# Altium footprint library custom.PcbLib: 317 footprints (part 10 of 20)
Each footprint in its own frame and in the unit in brackets; x right, y up, seen from the top. Pads: shape width x height; smd on the part's side, far side on the other; paste and mask are expansions set on the pad; w line width, h text height; cw(c..) or ccw(c..) is an arc to the next point about the centre after c.
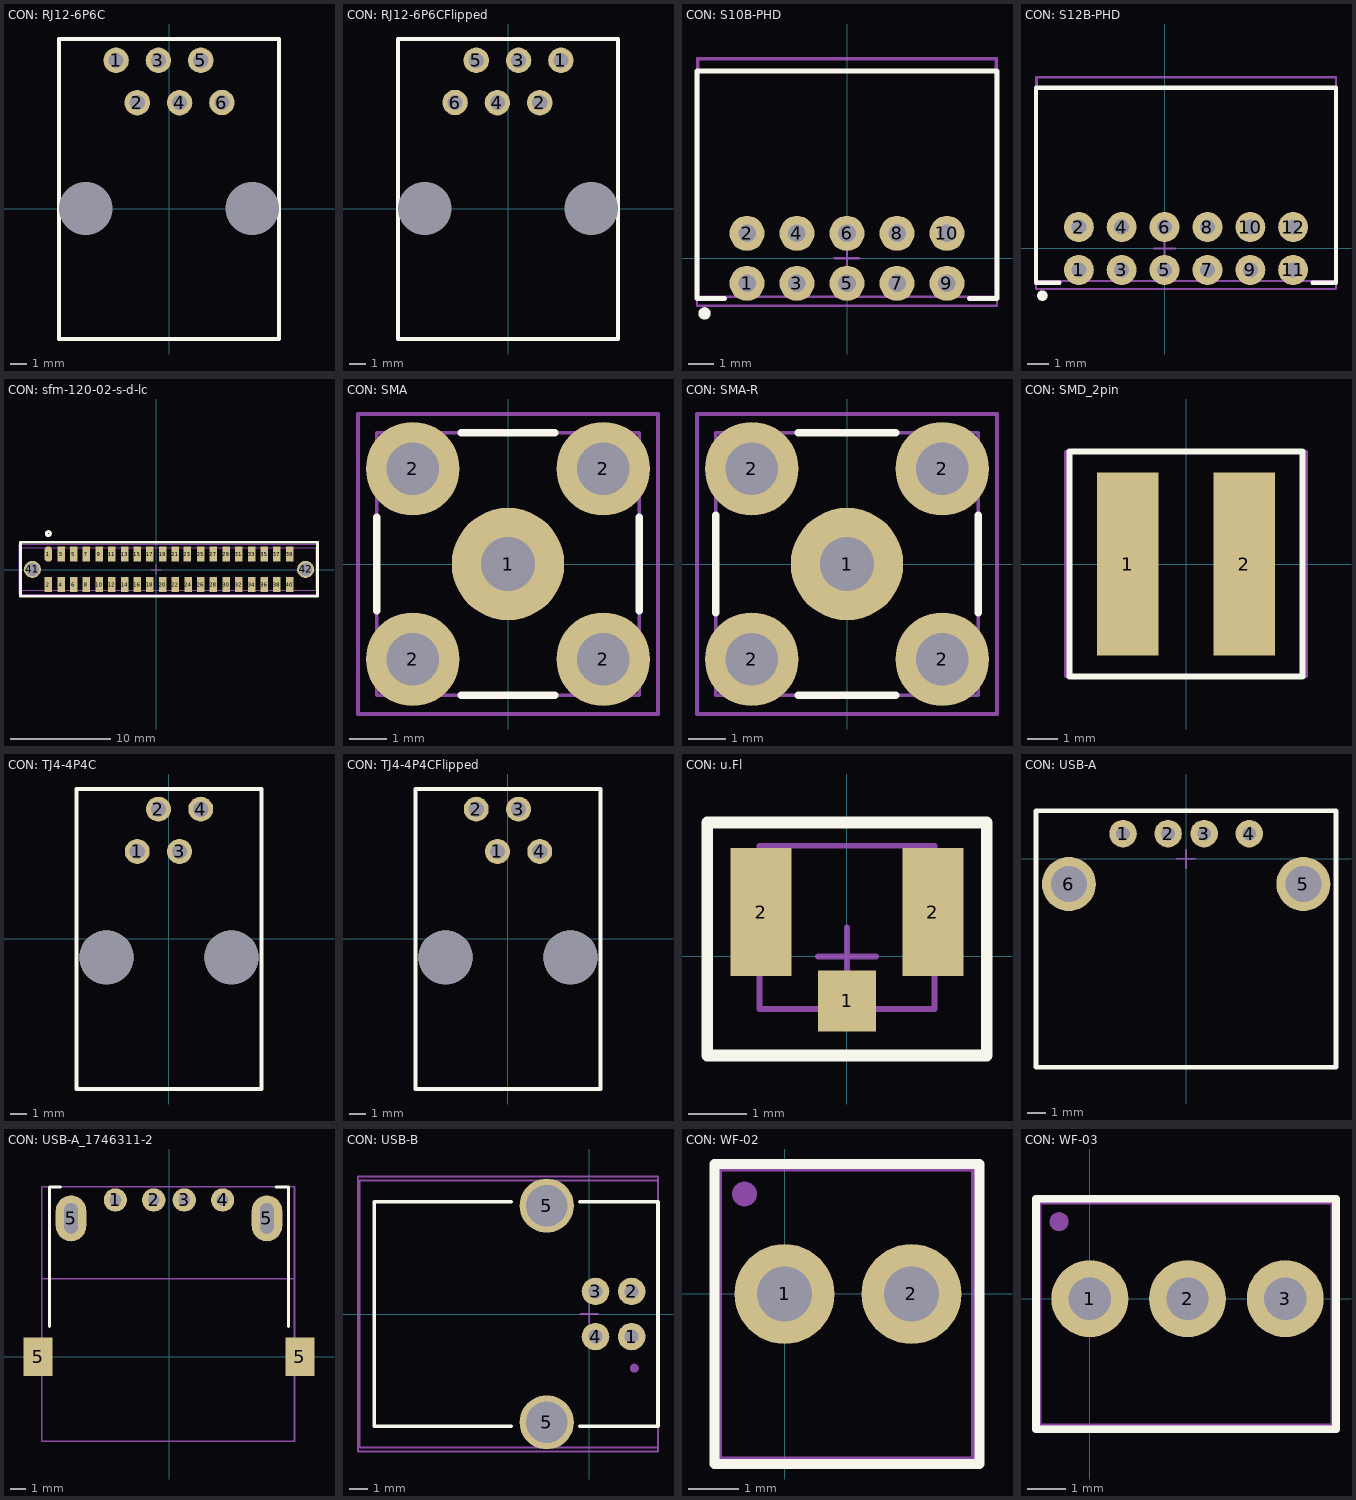
[diagram p9: the footprints below, top view; thin cyan lines are the x and y axes]

## CON: RJ12-6P6C [mil]
pads (8):
  round 60 hole 35.43: 1(-125,350) 2(-75,250) 3(-25,350) 4(25,250) 5(75,350) 6(125,250.39)
  round 60 hole 125.98 unplated: ""(-196.85,0) ""(196.85,0)
Top Overlay:
  lines w10: -259.84,-308.27 259.84,-308.27 259.84,400.39 -259.84,400.39 -259.84,-308.27
3D body "RJ12-6P6C.SLDPRT": height 460.63, standoff -129.92, extent -259.84,-308.27 259.84,400.39

## CON: RJ12-6P6CFlipped [mil]
pads (8):
  round 60 / inner round 60 / far side round 0 hole 35.43 unplated paste-99999: 1(125,350) 2(75,250) 3(25,350) 4(-25,250) 5(-75,350) 6(-125,250.39)
  round 60 hole 125.98 unplated: ""(-196.85,0) ""(196.85,0)
Top Overlay:
  lines w10: -259.84,-308.27 -259.84,400.39 259.84,400.39 259.84,-308.27 -259.84,-308.27
3D body "RJ12-6P6C.SLDPRT": height 70.87, standoff -519.68, extent -259.84,-308.27 259.84,400.39

## CON: S10B-PHD [mm]
pads (11):
  round 1.4 hole 0.7: 1(-4,-1) 2(-4,1) 3(-2,-1) 4(-2,1) 5(0,-1) 6(0,1) 7(2,-1) 8(2,1) 9(4,-1) 10(4,1)
  round 0.5 on Top Overlay: ""(-5.7,-2.2)
Top Overlay:
  lines w0.2: -4.9,-1.6 -5.9,-1.6 -6,-1.6 -6,7.5 6,7.5 6,-1.6 5.9,-1.6 4.9,-1.6
Top Assy:
  lines w0.1: -5.95,-1.525 5.95,-1.525 5.95,7.975 -5.95,7.975 -5.95,-1.525
Size Area:
  lines w0.1: -0.5,0 0.5,0 ; 0,-0.5 0,0.5 ; -6,-1.9 6,-1.9 6,8 -6,8 -6,-1.9
3D body "S10B-PHD.STEP": height 5, standoff -3, extent -5.95,-1.525 5.95,7.975

## CON: S12B-PHD [mm]
pads (13):
  round 1.4 hole 0.7: 1(-4,-1) 2(-4,1) 3(-2,-1) 4(-2,1) 5(0,-1) 6(0,1) 7(2,-1) 8(2,1) 9(4,-1) 10(4,1) 11(6,-1) 12(6,1)
  round 0.5 on Top Overlay: ""(-5.7,-2.2)
Top Overlay:
  lines w0.2: -4.9,-1.6 -5.9,-1.6 -6,-1.6 -6,7.5 8,7.5 8,-1.6 ; 6.9,-1.6 7.9,-1.6
Top Assy:
  lines w0.1: -5.95,-1.525 -5.95,7.975 8,7.975 8,-1.525 -5.95,-1.525
Size Area:
  lines w0.1: -0.5,0 0.5,0 ; 0,-0.5 0,0.5 ; -6,-1.9 8,-1.9 8,8 -6,8 -6,-1.9
3D body "S12B-PHDSS.STEP": height 5, standoff 0, extent -5.95,-1.525 7.95,7.975

## CON: sfm-120-02-s-d-lc [mm]
height 10
pads (42):
  oct 0.75x1.5 smd: 1(-10.8,1.55)
  rect 0.75x1.5 smd: 2(-10.8,-1.5) 3(-9.53,1.55) 4(-9.53,-1.5) 5(-8.26,1.55) 6(-8.26,-1.5) 7(-6.99,1.55) 8(-6.99,-1.5) 9(-5.72,1.55) 10(-5.72,-1.5) 11(-4.45,1.55) 12(-4.45,-1.5) 13(-3.18,1.55) 14(-3.18,-1.5) 15(-1.91,1.55) 16(-1.91,-1.5) 17(-0.64,1.55) 18(-0.64,-1.5) 19(0.63,1.55) 20(0.63,-1.5) 21(1.9,1.55) 22(1.9,-1.5) 23(3.11,1.55) 24(3.17,-1.5) 25(4.44,1.55) 26(4.44,-1.5) 27(5.71,1.55) 28(5.71,-1.5) 29(6.98,1.55) 30(6.98,-1.5) 31(8.25,1.55) 32(8.25,-1.5) 33(9.52,1.55) 34(9.52,-1.5) 35(10.79,1.55) 36(10.79,-1.5) 37(12.06,1.55) 38(12.06,-1.5) 39(13.33,1.55) 40(13.33,-1.5)
  round 1.7 hole 1.3: 41(-12.39,0.025) 42(14.92,0.025)
Top Overlay:
  circle w0.3: c-10.8,3.6 r0.2
  lines w0.254: -13.585,-2.675 16.115,-2.675 16.115,2.725 -13.585,2.725 -13.585,-2.675
Top Assy:
  lines w0.1: -13.435,-2.075 -13.435,2.2 15.965,2.2 15.965,-2.075 -13.435,-2.075
Size Area:
  lines w0.05: -13.735,-2.475 16.265,-2.475 16.265,2.525 -13.735,2.525 -13.735,-2.475
  lines w0.1: -0.5,-0.03 0.5,-0.03 ; 0,-0.53 0,0.47
3D body "SFM-120-02-L-D-LC-TR.stp": height 4.72, standoff -1.5, extent -13.403,-2.07 15.934,2.184

## CON: SMA [mm]
pads (5):
  round 3 hole 1.45: 1(0,0)
  round 2.5 hole 1.4: 2(-2.54,-2.54) 2(-2.54,2.54) 2(2.54,-2.54) 2(2.54,2.54)
Top Overlay:
  lines w0.2: -3.5,-1.25 -3.5,1.25 ; -1.25,-3.5 1.25,-3.5 ; -1.25,3.5 1.25,3.5 ; 3.5,-1.25 3.5,1.25
Top Assy:
  lines w0.1: -3.5,-3.5 -3.5,3.5 3.5,3.5 3.5,-3.5 -3.5,-3.5
Size Area:
  lines w0.1: -0.5,0 0.5,0 ; 0,-0.5 0,0.5 ; -4,-4 4,-4 4,4 -4,4 -4,-4
3D body "SMA_connector.STEP": height 9.53, standoff -3.94, extent -3.5,-3.5 3.5,3.5

## CON: SMA-R [mm]
pads (5):
  round 3 hole 1.45: 1(0,0)
  round 2.5 hole 1.4: 2(-2.54,-2.54) 2(-2.54,2.54) 2(2.54,-2.54) 2(2.54,2.54)
Top Overlay:
  lines w0.2: -3.5,-1.3 -3.5,1.3 ; -1.3,-3.5 1.3,-3.5 ; -1.3,3.5 1.3,3.5 ; 3.5,-1.3 3.5,1.3
Top Assy:
  lines w0.1: -3.5,-3.5 -3.5,3.5 3.5,3.5 3.5,-3.5 -3.5,-3.5
Size Area:
  lines w0.1: -0.5,0 0.5,0 ; 0,-0.5 0,0.5 ; -4,-4 4,-4 4,4 -4,4 -4,-4
3D body "Samtec-SMA-J-P-H-RA-TH1.STEP": height 10.26, standoff -3.84, extent -3.5,-3.5 3.5,11.6

## CON: SMD_2pin [mm] "3.81 2pin screw connector"
height 9
pads (2):
  rect 2x6 smd: 1(-1.905,0) 2(1.905,0)
Top Overlay:
  lines w0.2: -3.81,-3.683 3.81,-3.683 3.81,3.683 -3.81,3.683 -3.81,-3.683
Top Assy:
  lines w0.1: -3.815,-3.5 -3.815,3.5 ; 3.805,-3.5 3.805,3.5
Size Area:
  lines w0.1: -3.937,-3.683 3.937,-3.683 3.937,3.683 -3.937,3.683 -3.937,-3.683

## CON: TJ4-4P4C [mil] "TJ4-4P4C"
pads (6):
  round 59 hole 36 paste-99999 mask+2: 1(-75,206.69) 2(-25,306.69) 3(25,206.69) 4(75,306.69)
  round 127.95 hole 127.95 unplated paste-99999: ""(-147.64,-43.31) ""(147.64,-43.31)
Top Overlay:
  lines w10: -218.5,-354.33 218.5,-354.33 218.5,354.33 -218.5,354.33 -218.5,-354.33
Size Area:
  circle w59.05: c-147.64,-43.31 r29.53
  circle w59.05: c147.64,-43.31 r29.53
3D body "TJ4-4P4C.SLDPRT": height 452.76, standoff -137.8, extent -220.47,-351.38 220.47,357.28

## CON: TJ4-4P4CFlipped [mil]
pads (6):
  round 59 / inner round 59 / far side round 0 hole 36 unplated paste-99999: 1(-25,206.69) 2(-75,306.69) 3(25,306.69) 4(75,206.69)
  round 127.95 hole 127.95 unplated paste-99999: ""(-147.64,-43.31) ""(147.64,-43.31)
Top Overlay:
  lines w10: -218.5,-354.33 218.5,-354.33 218.5,354.33 -218.5,354.33 -218.5,-354.33
Size Area:
  circle w59.05: c-147.64,-43.31 r29.53
  circle w59.05: c147.64,-43.31 r29.53
3D body "TJ4-4P4C.STEP": height 78.74, standoff -511.81, extent -220.47,-351.38 220.47,357.28

## CON: u.Fl [mm]
height 1.5
pads (3):
  rect 1x1.05 smd: 1(0,-0.763)
  rect 1.05x2.2 smd: 2(-1.475,0.763) 2(1.475,0.763)
Top Overlay:
  lines w0.2: -2.4,-1.7 2.4,-1.7 2.4,2.3 -2.4,2.3 -2.4,-1.7
Top Assy:
  lines w0.1: -1.5,-0.9 1.5,-0.9 1.5,1.9 -1.5,1.9 -1.5,-0.9
Size Area:
  lines w0.1: -0.5,0 0.5,0 ; 0,-0.5 0,0.5 ; -2.4,-1.7 -2.4,2.3 2.4,2.3 2.4,-1.7 -2.4,-1.7
3D body "IPX.step": height 1.27, standoff -0.01, extent -1.5,-0.95 1.5,1.9

## CON: USB-A [mil]
height 196.85
pads (6):
  round 60 hole 30: 1(-137.8,55) 2(-39.37,55) 3(39.37,55) 4(137.8,55)
  round 118.11 hole 78.74: 5(255.91,-55) 6(-255.91,-55)
Top Overlay:
  lines w10: -327.8,-455 327.2,-455 327.2,105 -327.8,105 -327.8,-455
Top Assy:
  lines w3.94: -327.8,-455 327.2,-455 327.2,105 -327.8,105 -327.8,-455
Size Area:
  lines w1.97: -327.8,-455 -327.8,105 327.2,105 327.2,-455 -327.8,-455
  lines w3.94: -19.69,0 19.68,0 ; 0,-19.68 0,19.69
3D body "USB_A_PCB.STEP": height 301.38, standoff -142.52, extent -319.08,-456.41 320.05,94.77

## CON: USB-A_1746311-2 [mm]
pads (8):
  round 1.524 hole 0.762: 1(-3.5,10.25) 2(-1,10.25) 3(1,10.25) 4(3.5,10.25)
  rect 1.9x2.5 smd: 5(-8.55,0) 5(8.55,0)
  oval 2x3 hole 0.9 slot 2 at 90 deg: 5(-6.4,9.05) 5(6.4,9.05)
Top Overlay:
  lines w0.2: -7.8,2 -7.8,11.1 -7.1,11.1 ; 7,11.1 7.8,11.1 7.8,2
Top Assy:
  lines w0.1: -8.3,5.1 8.2,5.1 ; -8.3,-5.5 -8.3,-1 -8.3,1 -8.3,11.1 8.2,11.1 8.2,1 8.2,-1 8.2,-5.5 -8.3,-5.5
3D body "c-1746311-2-g1-3d.stp": height 4.1, standoff -4.52, extent -8.25,-5.45 8.25,11.05

## CON: USB-B [mm] "USB-B connector on PCB"
height 12
pads (7):
  round 1.524 hole 0.762: 1(2.35,-1.25) 2(2.35,1.25) 3(0.35,1.25) 4(0.35,-1.25)
  round 3 hole 2.3: 5(-2.35,-6) 5(-2.35,6)
  round 0.5 on Mech1: ""(2.5,-3)
Top Overlay:
  lines w0.2: -4.318,-6.223 -11.9,-6.223 -11.9,6.223 -4.318,6.223 ; -0.508,-6.223 3.81,-6.223 3.81,6.223 -0.508,6.223
Top Assy:
  lines w0.1: -12.708,-7.399 3.792,-7.399 3.792,7.4 -12.708,7.4 -12.708,-7.399
Size Area:
  lines w0.1: -0.5,0 0.5,0 ; 0,-0.5 0,0.5 ; -12.8,-7.62 -12.8,7.62 3.81,7.62 3.81,-7.62 -12.8,-7.62
3D body "USB-B-S-X-W-TH.STEP": height 11, standoff -3.64, extent -12.708,-7.398 3.792,7.4

## CON: WF-02 [mm]
pads (3):
  round 2 hole 1.1: 1(0,0) 2(2.54,0)
  round 0.5 on Mech1: ""(-0.8,2)
Top Overlay:
  lines w0.2: -1.4,-3.4 -1.4,2.6 3.9,2.6 3.9,-3.4 -1.4,-3.4
Top Assy:
  lines w0.1: -1.3,-3.3 3.78,-3.3 3.78,2.5 -1.3,2.5 -1.3,-3.3
3D body "User Library-WF-02.STEP": height 11.5, standoff -3.3, extent -1.3,-3.3 3.78,2.5

## CON: WF-03 [mm]
pads (4):
  round 2 hole 1.1: 1(0,0) 2(2.54,0) 3(5.08,0)
  round 0.5 on Mech1: ""(-0.8,2)
Top Overlay:
  lines w0.2: -1.4,-3.4 6.4,-3.4 6.4,2.6 -1.4,2.6 -1.4,-3.4
Top Assy:
  lines w0.1: -1.31,-3.3 6.31,-3.3 6.31,2.5 -1.31,2.5 -1.31,-3.3
3D body "User Library-WF-03.STEP": height 11.5, standoff -3.3, extent -1.31,-3.3 6.31,2.5